# Altium footprint library XU-GENARAL PCB .PcbLib: 1176 footprints (part 14 of 75)
Each footprint in its own frame and in the unit in brackets; x right, y up, seen from the top. Pads: shape width x height; smd on the part's side, far side on the other; paste and mask are expansions set on the pad; w line width, h text height; cw(c..) or ccw(c..) is an arc to the next point about the centre after c.
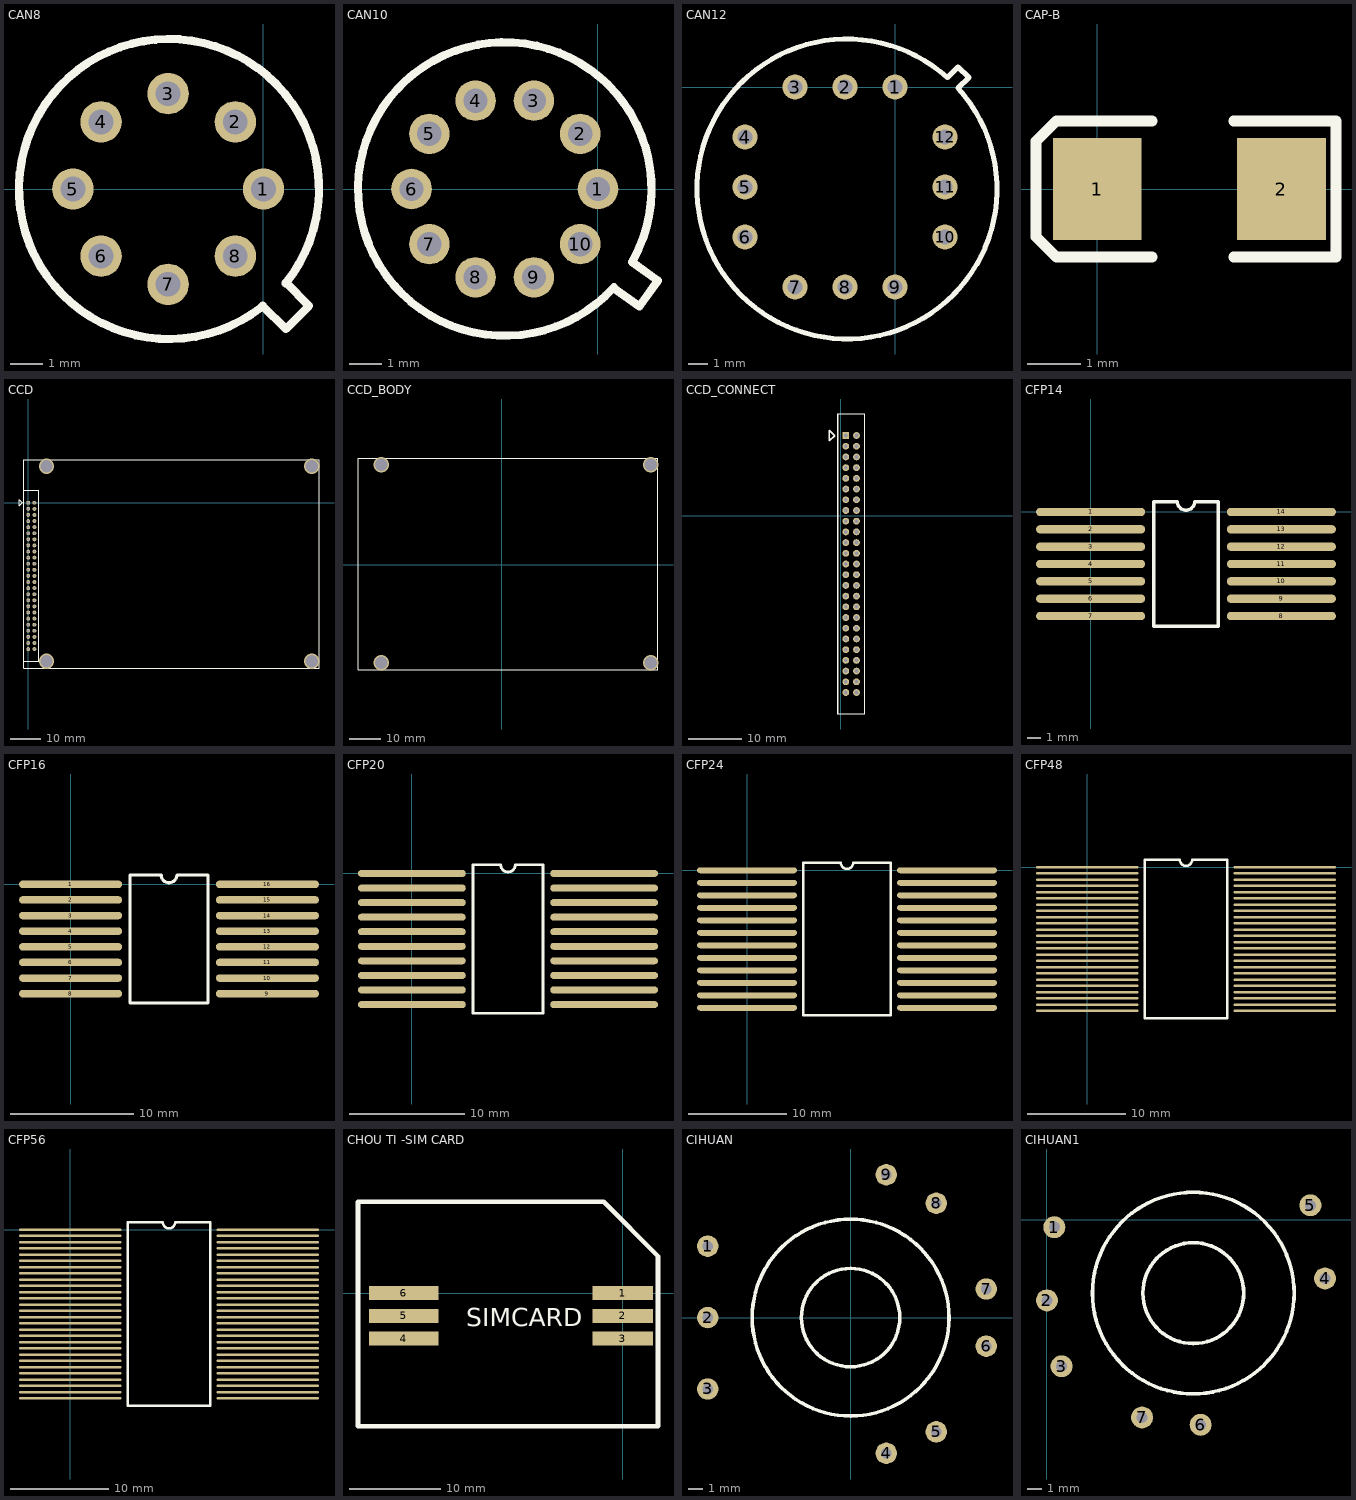
[diagram p13: the footprints below, top view; thin cyan lines are the x and y axes]

## CAN8 [mil]
pads (8):
  round 50 hole 30: 1(0,0) 2(-34,81) 3(-115,115) 4(-196,81) 5(-230,0) 6(-196,-81) 7(-115,-115) 8(-34,-81)
Top Overlay:
  lines w10: -2.57,-142.63 cw(c-114,0) 26.66,-113.91 ; -1,-141 27,-169 55,-141 27,-113

## CAN10 [mil]
pads (10):
  round 50 hole 30: 1(0,0) 2(-22,68) 3(-79,109) 4(-151,109) 5(-208,68) 6(-230,0) 7(-208,-68) 8(-151,-109) 9(-79,-109) 10(-22,-68)
Top Overlay:
  lines w10: 19,-122 51,-145 74,-113 42,-90 ; 19.51,-121.11 cw(c-115,0) 43.31,-87.75

## CAN12 [mil]
pads (12):
  round 50 hole 30: 1(0,0) 2(-100,0) 3(-200,0) 4(-300,-100) 5(-300,-200) 6(-300,-300) 7(-200,-400) 8(-100,-400) 9(0,-400) 10(100,-300) 11(100,-200) 12(100,-100)
Top Overlay:
  lines w10: 104.74,18.94 ccw(c-96,-204) 126.94,-3.26 ; 105,19 126,40 148,19 126,-2

## CAP-B [mil]
pads (2):
  rect 65x75 smd: 1(0,0) 2(135,0)
Top Overlay:
  lines w8: 40,-50 -30,-50 -45,-35 -45,35 -30,50 40,50 ; 100,-50 175,-50 175,50 100,50

## CCD [mm]
pads (50):
  rect 1.27x1.27 hole 0.7: 1(0,0)
  round 1.27 hole 0.7: 2(2,0) 3(0,-2) 4(2,-2) 5(0,-4) 6(2,-4) 7(0,-6) 8(2,-6) 9(0,-8) 10(2,-8) 11(0,-10) 12(2,-10) 13(0,-12) 14(2,-12) 15(0,-14) 16(2,-14) 17(0,-16) 18(2,-16) 19(0,-18) 20(2,-18) 21(0,-20) 22(2,-20) 23(0,-22) 24(2,-22) 25(0,-24) 26(2,-24) 27(0,-26) 28(2,-26) 29(0,-28) 30(2,-28) 31(0,-30) 32(2,-30) 33(0,-32) 34(2,-32) 35(0,-34) 36(2,-34) 37(0,-36) 38(2,-36) 39(0,-38) 40(2,-38) 41(0,-40) 42(2,-40) 43(0,-42) 44(2,-42) 45(0,-44) 46(2,-44) 47(0,-46) 48(2,-46) 49(0,-48) 50(2,-48)
via 92.998,11.991 diameter 5 hole 4
via 92.998,-52.009 diameter 5 hole 4
via 5.998,-52.009 diameter 5 hole 4
via 5.998,11.991 diameter 5 hole 4
Top Overlay:
  lines w0.2: -1.5,-52 -1.5,4.021 3.5,4.021 3.5,-52 -1.5,-52
  lines w0.254: -1.5,-3.438 -1.5,9.108 ; -1.5,-0.009 -1.5,-54.238 95.348,-54.238 95.348,7.484 95.348,14.061 93.851,14.061 ; -1.5,7.23 -1.5,14.061 95.147,14.061 ; -3.048,-1.016 -3.048,1.016 -2.032,0 -3.048,-1.016

## CCD_BODY [mil]
via -1531.87,1270.08 diameter 196.85 hole 157.48
via -1531.87,-1249.61 diameter 196.85 hole 157.48
via 1893.32,-1249.61 diameter 196.85 hole 157.48
via 1893.32,1270.08 diameter 196.85 hole 157.48
Top Overlay:
  lines w10: -1827.05,662.64 -1827.05,1156.6 ; -1827.05,797.64 -1827.05,-1337.36 1985.87,-1337.36 1985.87,1092.64 1985.87,1351.6 1926.91,1351.6 ; -1827.05,1082.64 -1827.05,1351.6 1977.95,1351.6

## CCD_CONNECT [mm]
pads (50):
  rect 1.27x1.27 hole 0.7: 1(0.94,14.961)
  round 1.27 hole 0.7: 2(2.94,14.961) 3(0.94,12.961) 4(2.94,12.961) 5(0.94,10.961) 6(2.94,10.961) 7(0.94,8.961) 8(2.94,8.961) 9(0.94,6.961) 10(2.94,6.961) 11(0.94,4.961) 12(2.94,4.961) 13(0.94,2.961) 14(2.94,2.961) 15(0.94,0.961) 16(2.94,0.961) 17(0.94,-1.039) 18(2.94,-1.039) 19(0.94,-3.039) 20(2.94,-3.039) 21(0.94,-5.039) 22(2.94,-5.039) 23(0.94,-7.039) 24(2.94,-7.039) 25(0.94,-9.039) 26(2.94,-9.039) 27(0.94,-11.039) 28(2.94,-11.039) 29(0.94,-13.039) 30(2.94,-13.039) 31(0.94,-15.039) 32(2.94,-15.039) 33(0.94,-17.039) 34(2.94,-17.039) 35(0.94,-19.039) 36(2.94,-19.039) 37(0.94,-21.039) 38(2.94,-21.039) 39(0.94,-23.039) 40(2.94,-23.039) 41(0.94,-25.039) 42(2.94,-25.039) 43(0.94,-27.039) 44(2.94,-27.039) 45(0.94,-29.039) 46(2.94,-29.039) 47(0.94,-31.039) 48(2.94,-31.039) 49(0.94,-33.039) 50(2.94,-33.039)
Top Overlay:
  lines w0.2: -0.56,-37.039 -0.56,18.981 4.44,18.981 4.44,-37.039 -0.56,-37.039
  lines w0.254: -0.56,-37.059 -0.56,14.951 ; -0.56,11.522 -0.56,18.847 ; -2.108,13.945 -1.092,14.961 -2.108,15.977 -2.108,13.945

## CFP14 [mil]
pads (14):
  oval 315x24 smd: 1(0,0) 2(0,-50) 3(0,-100) 4(0,-150) 5(0,-200) 6(0,-250) 7(0,-300) 8(550,-300) 9(550,-250) 10(550,-200) 11(550,-150) 12(550,-100) 13(550,-50) 14(550,0)
Top Overlay:
  lines w10: 182,-330 182,30 250,30 ccw(c275,30) 300,30 368,30 368,-330 182,-330

## CFP16 [mil]
pads (16):
  oval 330x24 smd: 1(0,0) 2(0,-50) 3(0,-100) 4(0,-150) 5(0,-200) 6(0,-250) 7(0,-300) 8(0,-350) 9(630,-350) 10(630,-300) 11(630,-250) 12(630,-200) 13(630,-150) 14(630,-100) 15(630,-50) 16(630,0)
Top Overlay:
  lines w10: 190,-380 190,30 290,30 ccw(c315,30) 340,30 440,30 440,-380 190,-380

## CFP20 [mil]
pads (20):
  oval 370x24 smd: 1(0,0) 2(0,-50) 3(0,-100) 4(0,-150) 5(0,-200) 6(0,-250) 7(0,-300) 8(0,-350) 9(0,-400) 10(0,-450) 11(660,-450) 12(660,-400) 13(660,-350) 14(660,-300) 15(660,-250) 16(660,-200) 17(660,-150) 18(660,-100) 19(660,-50) 20(660,0)
Top Overlay:
  lines w10: 210,-480 450,-480 450,30 355,30 cw(c330,30) 305,30 210,30 210,-480

## CFP24 [mil]
pads (24):
  oval 400x24 smd: 1(0,0) 2(0,-50) 3(0,-100) 4(0,-150) 5(0,-200) 6(0,-250) 7(0,-300) 8(0,-350) 9(0,-400) 10(0,-450) 11(0,-500) 12(0,-550) 13(800,-550) 14(800,-500) 15(800,-450) 16(800,-400) 17(800,-350) 18(800,-300) 19(800,-250) 20(800,-200) 21(800,-150) 22(800,-100) 23(800,-50) 24(800,0)
Top Overlay:
  lines w10: 225,-580 575,-580 575,30 425,30 cw(c400,30) 375,30 225,30 225,-580

## CFP48 [mil]
pads (48):
  oval 410x10 smd: 1(0,0) 2(0,-25) 3(0,-50) 4(0,-75) 5(0,-100) 6(0,-125) 7(0,-150) 8(0,-175) 9(0,-200) 10(0,-225) 11(0,-250) 12(0,-275) 13(0,-300) 14(0,-325) 15(0,-350) 16(0,-375) 17(0,-400) 18(0,-425) 19(0,-450) 20(0,-475) 21(0,-500) 22(0,-525) 23(0,-550) 24(0,-575) 25(790,-575) 26(790,-550) 27(790,-525) 28(790,-500) 29(790,-475) 30(790,-450) 31(790,-425) 32(790,-400) 33(790,-375) 34(790,-350) 35(790,-325) 36(790,-300) 37(790,-275) 38(790,-250) 39(790,-225) 40(790,-200) 41(790,-175) 42(790,-150) 43(790,-125) 44(790,-100) 45(790,-75) 46(790,-50) 47(790,-25) 48(790,0)
Top Overlay:
  lines w10: 230,-605 230,30 370,30 ccw(c395,30) 420,30 560,30 560,-605 230,-605

## CFP56 [mil]
pads (56):
  oval 410x10 smd: 1(0,0) 2(0,-25) 3(0,-50) 4(0,-75) 5(0,-100) 6(0,-125) 7(0,-150) 8(0,-175) 9(0,-200) 10(0,-225) 11(0,-250) 12(0,-275) 13(0,-300) 14(0,-325) 15(0,-350) 16(0,-375) 17(0,-400) 18(0,-425) 19(0,-450) 20(0,-475) 21(0,-500) 22(0,-525) 23(0,-550) 24(0,-575) 25(0,-600) 26(0,-625) 27(0,-650) 28(0,-675) 29(790,-675) 30(790,-650) 31(790,-625) 32(790,-600) 33(790,-575) 34(790,-550) 35(790,-525) 36(790,-500) 37(790,-475) 38(790,-450) 39(790,-425) 40(790,-400) 41(790,-375) 42(790,-350) 43(790,-325) 44(790,-300) 45(790,-275) 46(790,-250) 47(790,-225) 48(790,-200) 49(790,-175) 50(790,-150) 51(790,-125) 52(790,-100) 53(790,-75) 54(790,-50) 55(790,-25) 56(790,0)
Top Overlay:
  lines w10: 230,-705 230,30 370,30 ccw(c395,30) 420,30 560,30 560,-705 230,-705

## CHOU TI -SIM CARD [mil]
pads (6):
  rect 260x60 smd: 1(0,0) 2(0,-98.42) 3(0,-196.85)
  rect 300x60 smd: 4(-944.88,-196.85) 5(-944.88,-98.42) 6(-944.88,0)
Top Overlay:
  lines w20: -1141.73,-574.8 -1141.73,393.7 -82.68,393.7 151.97,159.06 151.97,-574.8 -1141.73,-574.8
  text "SIMCARD" at -675,-143 h78.74

## CIHUAN [mil]
pads (9):
  round 60 hole 30: 1(-400,200) 2(-400,0) 3(-400,-200) 4(100,-380) 5(240,-320) 6(380,-80) 7(380,80) 8(240,320) 9(100,400)
Top Overlay:
  circle w10: c0,0 r275.59
  circle w10: c0,0 r137.79

## CIHUAN1 [mil]
pads (7):
  round 60 hole 30: 1(20,-20) 2(0,-220) 3(40,-400) 4(760,-160) 5(720,40) 6(420,-560) 7(260,-540)
Top Overlay:
  circle w10: c400,-200 r137.79
  circle w10: c400,-200 r275.59